# Altium footprint library Misc.PcbLib: 159 footprints (part 8 of 10)
Each footprint in its own frame and in the unit in brackets; x right, y up, seen from the top. Pads: shape width x height; smd on the part's side, far side on the other; paste and mask are expansions set on the pad; w line width, h text height; cw(c..) or ccw(c..) is an arc to the next point about the centre after c.
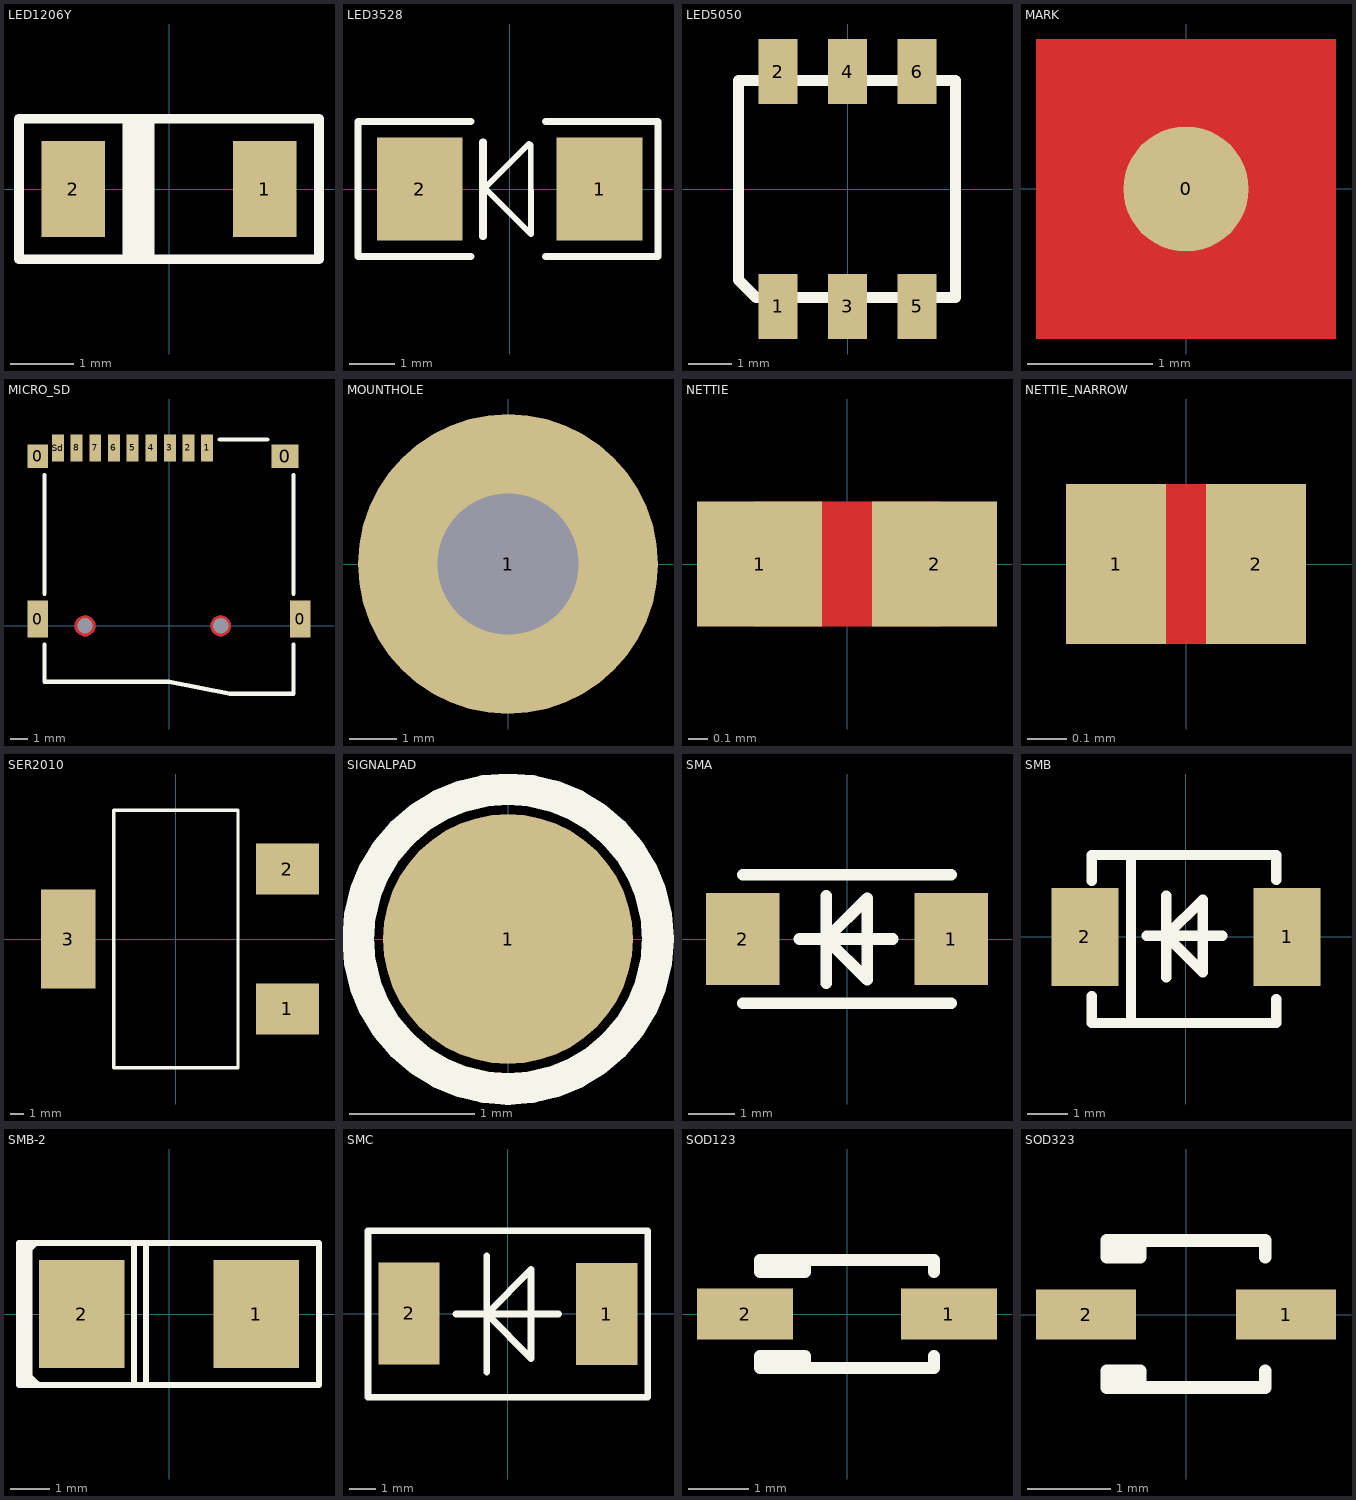
[diagram p7: the footprints below, top view; thin cyan lines are the x and y axes]

## LED1206Y [mil]
pads (2):
  rect 40x60 smd: 1(60,0) 2(-60,0)
Top Overlay:
  region: -9,44 -29,44 -29,-44 -9,-44
  lines w6: -94,-44 94,-44 94,44 -94,44 -94,-44
3D body "User Library-User Library-led_0805 YEL.STEP": height 43.31, standoff 0, extent -39.77,-24.61 39.76,24.6

## LED3528 [mm]
pads (2):
  rect 1.905x2.286 smd: 1(2,0) 2(-2,0)
Top Overlay:
  lines w0.127: 0.432,1.007 -0.553,0.022 0.461,-0.992 0.48,-0.992 ; 0.47,0.978 0.474,-0.999
  lines w0.15: -0.857,-1.5 -3.371,-1.5 -3.371,1.5 -0.857,1.5 ; 0.8,-1.5 3.3,-1.5 3.3,1.5 0.8,1.5
  lines w0.17: -0.59,-1.052 -0.59,1.04

## LED5050 [mm]
pads (6):
  rect 0.9x1.5 smd: 1(-1.6,-2.705) 2(-1.6,2.705) 3(0,-2.705) 4(0,2.705) 5(1.6,-2.705) 6(1.6,2.705)
Top Overlay:
  lines w0.254: -2.515,-2.019 -2.515,2.502 2.489,2.502 2.489,-2.502 -2.108,-2.502 -2.515,-2.095 -2.515,-1.714
3D body "User Library-smd_led_5050.step": height 1.6, standoff 0, extent -2.525,-2.632 2.475,2.668

## MARK [mm]
pads (1):
  round 1 smd mask+0.5: 0(0,0)
Top Layer:
  pour cut-out: 1.2,1.2 -1.2,1.2 -1.2,-1.2 1.2,-1.2

## MICRO_SD [mm]
height 0.95
pads (15):
  rect 1.2x2.2 smd: 0(-7.75,0.4) 0(7.75,0.4)
  rect 1.2x1.4 smd: 0(-7.75,10)
  round 0 hole 0.9 unplated: 0(-4.95,0) 0(3.05,0)
  rect 1.6x1.4 smd: 0(6.85,10)
  rect 0.7x1.6 smd: 1(2.25,10.5) 2(1.15,10.5) 3(0.05,10.5) 4(-1.05,10.5) 5(-2.15,10.5) 6(-3.25,10.5) 7(-4.35,10.5) 8(-5.45,10.5) Sd(-6.55,10.5)
Top Layer:
  pour cut-out: 3.05,0.6 3.169,0.6 3.39,0.509 3.559,0.34 3.65,0.119 3.65,0 3.65,-0.119 3.559,-0.34 3.39,-0.509 3.169,-0.6 3.05,-0.6 2.931,-0.6 2.71,-0.509 2.541,-0.34 2.45,-0.119 2.45,0 2.45,0.119 2.541,0.34 2.71,0.509 2.931,0.6
  pour cut-out: -4.95,0.6 -4.831,0.6 -4.61,0.509 -4.441,0.34 -4.35,0.119 -4.35,0 -4.35,-0.119 -4.441,-0.34 -4.61,-0.509 -4.831,-0.6 -4.95,-0.6 -5.069,-0.6 -5.29,-0.509 -5.459,-0.34 -5.55,-0.119 -5.55,0 -5.55,0.119 -5.459,0.34 -5.29,0.509 -5.069,0.6
Bottom Layer:
  pour cut-out: -4.95,0.6 -4.831,0.6 -4.61,0.509 -4.441,0.34 -4.35,0.119 -4.35,0 -4.35,-0.119 -4.441,-0.34 -4.61,-0.509 -4.831,-0.6 -4.95,-0.6 -5.069,-0.6 -5.29,-0.509 -5.459,-0.34 -5.55,-0.119 -5.55,0 -5.55,0.119 -5.459,0.34 -5.29,0.509 -5.069,0.6
  pour cut-out: 3.05,0.6 3.169,0.6 3.39,0.509 3.559,0.34 3.65,0.119 3.65,0 3.65,-0.119 3.559,-0.34 3.39,-0.509 3.169,-0.6 3.05,-0.6 2.931,-0.6 2.71,-0.509 2.541,-0.34 2.45,-0.119 2.45,0 2.45,0.119 2.541,0.34 2.71,0.509 2.931,0.6
Top Overlay:
  lines w0.254: -7.35,-1.1 -7.35,-3.3 0,-3.3 3.6,-4 7.35,-4 7.35,-1.1 ; -7.35,1.9 -7.35,8.9 ; 3,11 5.8,11 ; 7.35,1.9 7.35,8.9

## MOUNTHOLE [mm]
pads (1):
  round 6.4 hole 3 unplated mask+0.102: 1(0,0)
Top Overlay:
  lines w1.2: -2.287,0.24 cw(c0,0) -1.861,1.352 ; -1.861,-1.352 ccw(c0,0) -0.935,-2.101 ; -0.478,2.25 cw(c0,0) 0.711,2.187 ; 0.711,-2.187 ccw(c0,0) 1.709,-1.539 ; 1.992,1.15 cw(c0,0) 2.3,0
Bottom Overlay:
  lines w1.2: -2.287,0.24 cw(c0,0) -1.861,1.352 ; -1.861,-1.352 ccw(c0,0) -0.935,-2.101 ; -0.478,2.25 cw(c0,0) 0.711,2.187 ; 0.711,-2.187 ccw(c0,0) 1.709,-1.539 ; 1.992,1.15 cw(c0,0) 2.3,0

## NETTIE [mil]
pads (2):
  rect 25x25 smd: 1(-17.5,0) 2(17.5,0)
Top Layer:
  lines w25: -17.5,0 17.5,0

## NETTIE_NARROW [mil]
pads (2):
  rect 10x16 smd: 1(-7,0) 2(7,0)
Top Layer:
  rectangle: -10,-8 10,8

## SER2010 [mil]
height 370.08
pads (3):
  rect 185x150 smd: 1(327.5,-205) 2(327.5,205)
  rect 160x290 smd: 3(-315,0)
Top Overlay:
  lines w10: -182.5,-377.5 182.5,-377.5 182.5,377.5 -182.5,377.5 -182.5,-377.5
3D body "Coilcraft-SER2010.STEP": height 397.24, standoff -0.52, extent -324.41,-387.59 411.81,387.6

## SIGNALPAD [mm]
pads (1):
  round 2 smd: 1(0,0)
Top Overlay:
  circle w0.254: c0,0 r1.2

## SMA [mm] "DO-214AC(2010)"
pads (2):
  rect 1.6x2 smd: 1(2.268,0) 2(-2.268,0)
Top Overlay:
  lines w0.254: -2.268,1.397 2.268,1.397 ; -2.05,-1.397 -2.268,-1.397 2.268,-1.397 ; -1.034,0 0.998,0 ; -0.45,-0.965 -0.45,0.94 ; -0.45,0 0.439,0.889 0.439,-0.889 -0.45,0
3D body "DO-214AC.STEP": height 2.4, standoff 0, extent -2.318,-1.35 2.282,1.35

## SMB [mm] "DO-214AA"
pads (2):
  rect 1.65x2.4 smd: 1(2.475,0) 2(-2.475,0)
Top Overlay:
  lines w0.254: -2.311,-1.448 -2.311,-2.108 2.21,-2.108 2.21,-1.524 ; -2.311,1.372 -2.311,2.007 2.21,2.007 2.21,1.397 ; -1.346,-2.032 -1.346,2.007 ; -0.965,0.025 0.889,0.025 ; -0.483,-0.991 -0.483,1.016 ; -0.483,0.025 0.406,0.914 0.406,-0.864 -0.483,0.025
3D body "DI-214AA(SMB).step": height 2.45, standoff 0.03, extent -2.75,-1.975 2.75,1.925

## SMB-2 [mm]
pads (2):
  rect 2.159x2.743 smd: 1(2.21,0) 2(-2.21,0)
Top Overlay:
  region: -3.531,1.771 -3.758,1.771 -3.758,-1.488 -3.531,-1.488
  region: -3.664,-1.456 -3.758,-1.456 -3.758,-1.547 -3.664,-1.547
  region: -3.571,-1.517 -3.765,-1.517 -3.765,-1.756 -3.571,-1.756
  lines w0.15: -3.8,1.376 -3.376,1.8 ; -3.768,-1.341 -3.349,-1.76 ; -3.531,-1.793 -3.531,1.767 ; -0.884,-1.786 -0.884,1.725 ; -0.584,-1.746 -0.584,1.765 ; -3.8,-1.8 3.8,-1.8 3.8,1.8 -3.8,1.8 -3.8,-1.8

## SMC [mil] "DO-214AB(2114)"
pads (2):
  rect 90x149.84 smd: 1(145,-0.5)
  rect 90x149.63 smd: 2(-145,0.5)
Top Overlay:
  lines w10: -76,-0.5 74,-0.5 ; -31,-85.5 -31,84.5 ; -205,-122.55 -205,121.55 205,121.55 205,-122.55 -205,-122.55 ; -31,-0.5 34,-65.5 34,64.5 -31,-0.5
3D body "DO-214AB.STEP": height 106.3, standoff 0, extent -160.52,-122.55 159.17,121.54

## SOD123 [mm] "1206"
pads (2):
  rect 1.6x0.85 smd: 1(1.7,0) 2(-1.7,0)
Top Overlay:
  lines w0.2: -0.7,-0.9 -0.7,-0.7 ; -0.7,0.9 -0.7,0.7 -1.45,0.7 -1.45,0.9 1.45,0.9 1.45,0.7 ; 1.45,-0.7 1.45,-0.9 -1.45,-0.9 -1.45,-0.7 -0.7,-0.7 ; -0.7,-0.7 -0.7,-0.7
3D body "User Library-SOD-123_DiodesInc.STEP": height 1.42, standoff -0.03, extent -1.896,-0.853 1.954,0.847

## SOD323 [mm]
pads (2):
  rect 1.2x0.6 smd: 1(1.2,0) 2(-1.2,0)
Top Overlay:
  region: -0.55,0.889 -0.95,0.889 -0.95,0.689 -0.55,0.689
  region: -0.55,-0.677 -0.95,-0.677 -0.95,-0.877 -0.55,-0.877
  lines w0.152: -0.55,-0.877 -0.55,-0.677 -0.95,-0.677 -0.95,-0.877 0.95,-0.877 0.95,-0.677 ; -0.55,0.889 -0.55,0.689 -0.95,0.689 -0.95,0.889 0.95,0.889 0.95,0.689
3D body "SOD-323.STEP": height 1, standoff 0, extent -1.256,-0.633 1.344,0.667